# Altium footprint library lib_protel_HC_BOINA.PCBLIB: 726 footprints (part 14 of 46)
Each footprint in its own frame and in the unit in brackets; x right, y up, seen from the top. Pads: shape width x height; smd on the part's side, far side on the other; paste and mask are expansions set on the pad; w line width, h text height; cw(c..) or ccw(c..) is an arc to the next point about the centre after c.
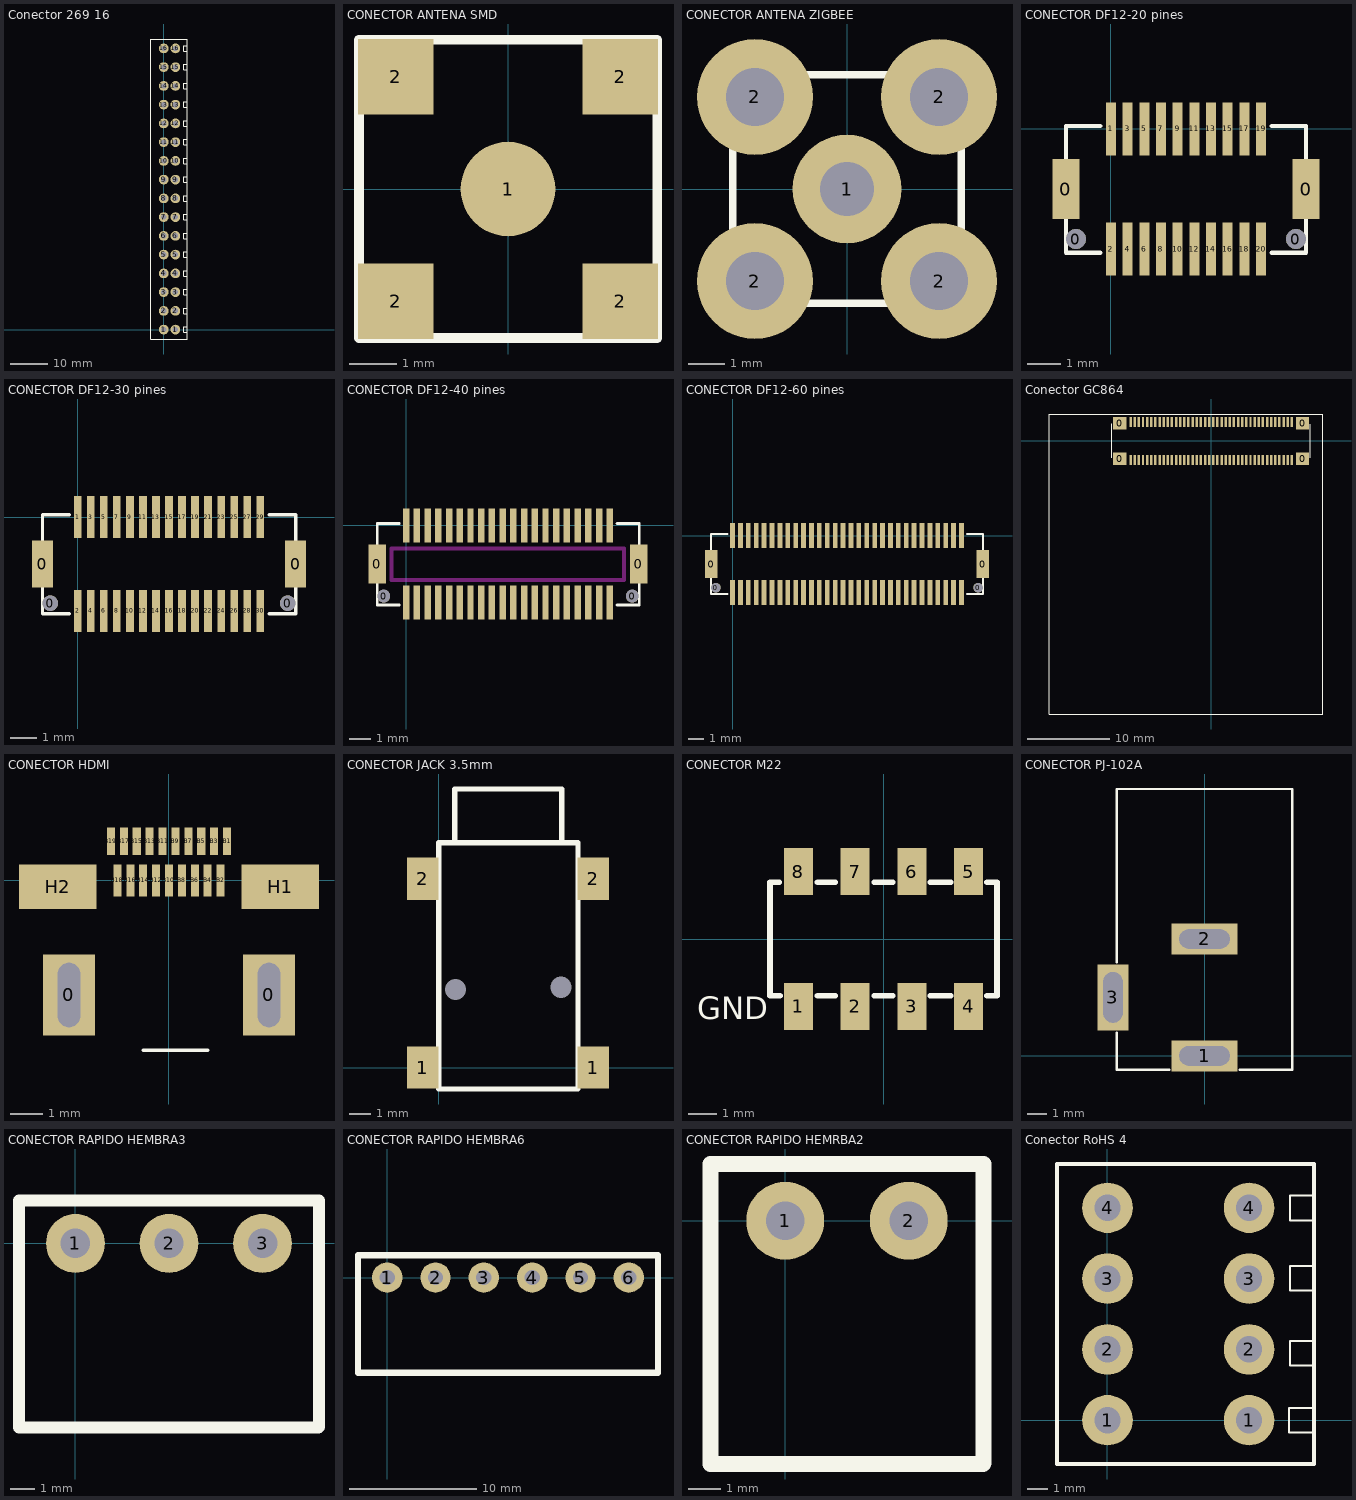
[diagram p13: the footprints below, top view; thin cyan lines are the x and y axes]

## Conector 269 16 [mm] "31269116"
height 16.5
pads (32):
  round 2.6 hole 1.4: 1(0,0) 1(3.1,0) 2(0,5) 2(3.1,5) 3(0,10) 3(3.1,10) 4(0,15) 4(3.1,15) 5(0,20) 5(3.1,20) 6(0,25) 6(3.1,25) 7(0,30) 7(3.1,30) 8(0,35) 8(3.1,35) 9(0,40) 9(3.1,40) 10(0,45) 10(3.1,45) 11(0,50) 11(3.1,50) 12(0,55) 12(3.1,55) 13(0,60) 13(3.1,60) 14(0,65) 14(3.1,65) 15(0,70) 15(3.1,70) 16(0,75) 16(3.1,75)
Top Overlay:
  lines w0.1: 6.3,-0.75 5.3,-0.75 5.3,0.75 6.3,0.75 ; 6.3,4.25 5.3,4.25 5.3,5.75 6.3,5.75 ; 6.3,9.25 5.3,9.25 5.3,10.75 6.3,10.75 ; 6.3,14.25 5.3,14.25 5.3,15.75 6.3,15.75 ; 6.3,19.25 5.3,19.25 5.3,20.75 6.3,20.75 ; 6.3,24.25 5.3,24.25 5.3,25.75 6.3,25.75 ; 6.3,29.25 5.3,29.25 5.3,30.75 6.3,30.75 ; 6.3,34.25 5.3,34.25 5.3,35.75 6.3,35.75 ; 6.3,39.25 5.3,39.25 5.3,40.75 6.3,40.75 ; 6.3,44.25 5.3,44.25 5.3,45.75 6.3,45.75 ; 6.3,49.25 5.3,49.25 5.3,50.75 6.3,50.75 ; 6.3,54.25 5.3,54.25 5.3,55.75 6.3,55.75 ; 6.3,59.25 5.3,59.25 5.3,60.75 6.3,60.75 ; 6.3,64.25 5.3,64.25 5.3,65.75 6.3,65.75 ; 6.3,69.25 5.3,69.25 5.3,70.75 6.3,70.75 ; 6.3,74.25 5.3,74.25 5.3,75.75 6.3,75.75 ; -3.5,-2.5 -3.5,77.5 6.3,77.5 6.3,-2.5 -3.5,-2.5

## CONECTOR ANTENA SMD [mm]
pads (5):
  round 2 smd: 1(0,0)
  rect 1.6x1.6 smd: 2(-2.37,-2.37) 2(-2.37,2.37) 2(2.37,-2.37) 2(2.37,2.37)
Top Overlay:
  lines w0.203: 3.123,-3.15 -3.15,-3.15 -3.15,3.15 3.123,3.15 ; 3.15,-3.15 3.15,3.15

## CONECTOR ANTENA ZIGBEE [mm]
pads (5):
  round 3 hole 1.5: 1(0,0)
  round 3.2 hole 1.6: 2(-2.54,-2.54) 2(-2.54,2.54) 2(2.54,-2.54) 2(2.54,2.54)
Top Overlay:
  lines w0.203: 3.123,-3.15 -3.15,-3.15 -3.15,3.15 3.123,3.15 ; 3.15,-3.15 3.15,3.15

## CONECTOR DF12-20 pines [mm] "microconector macho o hembra 3mm altura"
height 3
pads (24):
  rect 0.8x1.8 smd: 0(-1.35,-1.8) 0(5.85,-1.8)
  round 0.6 hole 0.6 mask+0: 0(-1.05,-3.3) 0(5.55,-3.3)
  rect 0.3x1.6 smd mask+0.102: 1(0,0) 2(0,-3.6) 3(0.5,0) 4(0.5,-3.6) 5(1,0) 6(1,-3.6) 7(1.5,0) 8(1.5,-3.6) 9(2,0) 10(2,-3.6) 11(2.5,0) 12(2.5,-3.6) 13(3,0) 14(3,-3.6) 15(3.5,0) 16(3.5,-3.6) 17(4,0) 18(4,-3.6) 19(4.5,0) 20(4.5,-3.6)
Top Overlay:
  lines w0.127: -0.32,-3.71 -1.35,-3.71 -1.35,0.09 -0.32,0.09 ; 4.82,-3.71 5.85,-3.71 5.85,0.09 4.82,0.09

## CONECTOR DF12-30 pines [mm] "microconector macho o hembra 3mm altura"
height 3
pads (34):
  rect 0.8x1.8 smd: 0(-1.35,-1.8) 0(8.35,-1.8)
  round 0.6 hole 0.6 mask+0: 0(-1.05,-3.3) 0(8.05,-3.3)
  rect 0.3x1.6 smd mask+0.102: 1(0,0) 2(0,-3.6) 3(0.5,0) 4(0.5,-3.6) 5(1,0) 6(1,-3.6) 7(1.5,0) 8(1.5,-3.6) 9(2,0) 10(2,-3.6) 11(2.5,0) 12(2.5,-3.6) 13(3,0) 14(3,-3.6) 15(3.5,0) 16(3.5,-3.6) 17(4,0) 18(4,-3.6) 19(4.5,0) 20(4.5,-3.6) 21(5,0) 22(5,-3.6) 23(5.5,0) 24(5.5,-3.6) 25(6,0) 26(6,-3.6) 27(6.5,0) 28(6.5,-3.6) 29(7,0) 30(7,-3.6)
Top Overlay:
  lines w0.127: -0.32,-3.71 -1.35,-3.71 -1.35,0.09 -0.32,0.09 ; 7.33,-3.71 8.36,-3.71 8.36,0.09 7.33,0.09

## CONECTOR DF12-40 pines [mm] "microconector macho o hembra 3mm altura"
height 3
pads (44):
  rect 0.8x1.8 smd: 0(-1.35,-1.8) 0(10.85,-1.8)
  round 0.6 hole 0.6 mask+0: 0(-1.05,-3.3) 0(10.55,-3.3)
  rect 0.3x1.6 smd mask+0.102: 1(0,0) 2(0,-3.6) 3(0.5,0) 4(0.5,-3.6) 5(1,0) 6(1,-3.6) 7(1.5,0) 8(1.5,-3.6) 9(2,0) 10(2,-3.6) 11(2.5,0) 12(2.5,-3.6) 13(3,0) 14(3,-3.6) 15(3.5,0) 16(3.5,-3.6) 17(4,0) 18(4,-3.6) 19(4.5,0) 20(4.5,-3.6) 21(5,0) 22(5,-3.6) 23(5.5,0) 24(5.5,-3.6) 25(6,0) 26(6,-3.6) 27(6.5,0) 28(6.5,-3.6) 29(7,0) 30(7,-3.6) 31(7.5,0) 32(7.5,-3.6) 33(8,0) 34(8,-3.6) 35(8.5,0) 36(8.5,-3.6) 37(9,0) 38(9,-3.6) 39(9.5,0) 40(9.5,-3.6)
Top Layer keep-out:
  lines w0.178: -0.69,-2.55 -0.69,-1.07 10.17,-1.07 10.17,-2.55 -0.69,-2.55
Top Overlay:
  lines w0.127: -0.32,-3.71 -1.35,-3.71 -1.35,0.09 -0.32,0.09 ; 9.84,-3.71 10.87,-3.71 10.87,0.09 9.84,0.09

## CONECTOR DF12-60 pines [mm] "microconector macho o hembra 3mm altura"
height 3
pads (64):
  rect 0.8x1.8 smd: 0(-1.35,-1.8) 0(15.85,-1.8)
  round 0.6 hole 0.6 mask+0: 0(-1.05,-3.3) 0(15.55,-3.3)
  rect 0.3x1.6 smd mask+0.102: 1(0,0) 2(0,-3.6) 3(0.5,0) 4(0.5,-3.6) 5(1,0) 6(1,-3.6) 7(1.5,0) 8(1.5,-3.6) 9(2,0) 10(2,-3.6) 11(2.5,0) 12(2.5,-3.6) 13(3,0) 14(3,-3.6) 15(3.5,0) 16(3.5,-3.6) 17(4,0) 18(4,-3.6) 19(4.5,0) 20(4.5,-3.6) 21(5,0) 22(5,-3.6) 23(5.5,0) 24(5.5,-3.6) 25(6,0) 26(6,-3.6) 27(6.5,0) 28(6.5,-3.6) 29(7,0) 30(7,-3.6) 31(7.5,0) 32(7.5,-3.6) 33(8,0) 34(8,-3.6) 35(8.5,0) 36(8.5,-3.6) 37(9,0) 38(9,-3.6) 39(9.5,0) 40(9.5,-3.6) 41(10,0) 42(10,-3.6) 43(10.5,0) 44(10.5,-3.6) 45(11,0) 46(11,-3.6) 47(11.5,0) 48(11.5,-3.6) 49(12,0) 50(12,-3.6) 51(12.5,0) 52(12.5,-3.6) 53(13,0) 54(13,-3.6) 55(13.5,0) 56(13.5,-3.6) 57(14,0) 58(14,-3.6) 59(14.5,0) 60(14.5,-3.6)
Top Overlay:
  lines w0.127: -0.32,-3.71 -1.35,-3.71 -1.35,0.09 -0.32,0.09 ; 14.84,-3.71 15.87,-3.71 15.87,0.09 14.84,0.09

## Conector GC864 [mm]
height 2
pads (84):
  rect 1.6x1.5 smd: 0(-11.05,-2.15) 0(-11.05,2.15) 0(11.05,-2.15) 0(11.05,2.15)
  rect 0.3x1.2 smd mask+0.07: 1(-9.75,2.3) 2(-9.75,-2.3) 3(-9.25,2.3) 4(-9.25,-2.3) 5(-8.75,2.3) 6(-8.75,-2.3) 7(-8.25,2.3) 8(-8.25,-2.3) 9(-7.75,2.3) 10(-7.75,-2.3) 11(-7.25,2.3) 12(-7.25,-2.3) 13(-6.75,2.3) 14(-6.75,-2.3) 15(-6.25,2.3) 16(-6.25,-2.3) 17(-5.75,2.3) 18(-5.75,-2.3) 19(-5.25,2.3) 20(-5.25,-2.3) 21(-4.75,2.3) 22(-4.75,-2.3) 23(-4.25,2.3) 24(-4.25,-2.3) 25(-3.75,2.3) 26(-3.75,-2.3) 27(-3.25,2.3) 28(-3.25,-2.3) 29(-2.75,2.3) 30(-2.75,-2.3) 31(-2.25,2.3) 32(-2.25,-2.3) 33(-1.75,2.3) 34(-1.75,-2.3) 35(-1.25,2.3) 36(-1.25,-2.3) 37(-0.75,2.3) 38(-0.75,-2.3) 39(-0.25,2.3) 40(-0.25,-2.3) 41(0.25,2.3) 42(0.25,-2.3) 43(0.75,2.3) 44(0.75,-2.3) 45(1.25,2.3) 46(1.25,-2.3) 47(1.75,2.3) 48(1.75,-2.3) 49(2.25,2.3) 50(2.25,-2.3) 51(2.75,2.3) 52(2.75,-2.3) 53(3.25,2.3) 54(3.25,-2.3) 55(3.75,2.3) 56(3.75,-2.3) 57(4.25,2.3) 58(4.25,-2.3) 59(4.75,2.3) 60(4.75,-2.3) 61(5.25,2.3) 62(5.25,-2.3) 63(5.75,2.3) 64(5.75,-2.3) 65(6.25,2.3) 66(6.25,-2.3) 67(6.75,2.3) 68(6.75,-2.3) 69(7.25,2.3) 70(7.25,-2.3) 71(7.75,2.3) 72(7.75,-2.3) 73(8.25,2.3) 74(8.25,-2.3) 75(8.75,2.3) 76(8.75,-2.3) 77(9.25,2.3) 78(9.25,-2.3) 79(9.75,2.3) 80(9.75,-2.3)
Top Overlay:
  lines w0.1: -12,-2.05 -12,2.05 ; 12,-2.05 12,2.025 ; -19.6,-33.025 -19.6,3.25 13.5,3.25 13.5,-33.025 -19.6,-33.025

## CONECTOR HDMI [mm] "CONECTOR FOR HDMI"
height 2.9
pads (23):
  rect 1.6x2.5 hole 0.7 slot 2 at 90 deg: 0(-3.1,-3.55) 0(3.1,-3.55)
  rect 0.25x0.85 smd: B1(1.8,1.21) B3(1.4,1.21) B5(1,1.21) B7(0.6,1.21) B9(0.2,1.21) B11(-0.2,1.21) B13(-0.6,1.21) B15(-1,1.21) B17(-1.4,1.21) B19(-1.8,1.21)
  rect 0.25x1 smd: B2(1.6,0) B4(1.2,0) B6(0.8,0) B8(0.4,0) B10(0,0) B12(-0.4,0) B14(-0.8,0) B16(-1.2,0) B18(-1.6,0)
  rect 2.4x1.38 smd: H1(3.45,-0.19) H2(-3.45,-0.19)
Top Overlay:
  lines w0.1: -0.8,-5.265 1.2,-5.265

## CONECTOR JACK 3.5mm [mm] "conector jack 3.5mm hembra SMD"
height 5
pads (6):
  round 0 on Top hole 1: 0(0.8,3.7) 0(5.8,3.81)
  rect 1.5x2 smd: 1(-0.762,0) 1(7.338,0) 2(-0.762,8.95) 2(7.338,8.95)
Top Overlay:
  lines w0.254: 0.762,10.668 0.762,13.208 5.842,13.208 5.842,10.668 ; 0,-1.016 6.604,-1.016 6.604,10.668 0,10.668 0,-1.016

## CONECTOR M22 [mm] "Conector programador smd"
height 6.7
pads (8):
  rect 1.02x1.65 smd: 1(-3,-2.375) 2(-1,-2.375) 3(1,-2.375) 4(3,-2.375) 5(3,2.375) 6(1,2.375) 7(-1,2.375) 8(-3,2.375)
Top Overlay:
  lines w0.2: -3.675,2 -4,2 -4,-2 -3.65,-2 ; -2.325,-2 -1.7,-2 ; -2.325,2 -1.7,2 ; -0.325,-2 0.325,-2 ; -0.325,2 0.325,2 ; 1.65,-2 2.375,-2 ; 1.65,2 2.375,2 ; 3.65,-2 4,-2 4,2 3.65,2
  text "GND" at -6.575,-2.825 h0.8

## CONECTOR PJ-102A [mm] "CONECTOR ALIMETACIÓN 2.1MM"
height 11
pads (3):
  rect 3.4x1.6 hole 1 slot 2.6 at 0 deg: 1(0,0) 2(0,6)
  rect 1.6x3.4 hole 1 slot 2.6 at 90 deg: 3(-4.7,3)
Top Overlay:
  lines w0.127: -4.51,-0.7 -1.82,-0.7 ; -4.51,-0.68 -4.51,1.19 ; -4.5,4.81 -4.5,13.7 ; -4.49,13.7 4.48,13.7 ; 1.82,-0.7 4.5,-0.7 4.5,13.7

## CONECTOR RAPIDO HEMBRA3 [mm] "Paso3.81mm altura 7mm"
height 7
pads (3):
  round 2.4 hole 1.2: 1(0,0) 2(3.81,0) 3(7.62,0)
Top Overlay:
  lines w0.5: -2.3,-7.5 9.9,-7.5 ; -2.3,-7.475 -2.3,1.75 9.875,1.75 ; 9.92,-7.475 9.92,1.75

## CONECTOR RAPIDO HEMBRA6 [mm] "Paso 3.81mm altura 7mm"
height 7
pads (6):
  round 2.4 hole 1.2: 1(0,0) 2(3.81,0) 3(7.62,0) 4(11.43,0) 5(15.24,0) 6(19.05,0)
Top Overlay:
  lines w0.5: -2.3,-7.5 21.35,-7.5 21.35,1.75 -2.3,1.75 -2.3,-7.475

## CONECTOR RAPIDO HEMRBA2 [mm] "Paso 3.81mm altura 7mm"
height 7
pads (2):
  round 2.4 hole 1.2: 1(0,0) 2(3.81,0)
Top Overlay:
  lines w0.5: -2.3,-7.5 6.1,-7.5 ; -2.3,-7.475 -2.3,1.75 6.11,1.75 6.11,-7.475

## Conector RoHS 4 [mm] "1824440000"
height 16.5
pads (8):
  round 2.5 hole 1.3: 1(0.01,0) 1(7.01,0) 2(0.01,3.5) 2(7.01,3.5) 3(0.01,7) 3(7.01,7) 4(0.01,10.5) 4(7.01,10.5)
Top Overlay:
  lines w0.1: 10.221,-0.61 8.993,-0.61 8.993,0.61 10.221,0.61 ; 10.272,2.692 9.043,2.692 9.043,3.912 10.272,3.912 ; 10.272,6.401 9.043,6.401 9.043,7.62 10.272,7.62 ; 10.272,9.881 9.043,9.881 9.043,11.1 10.272,11.1
  lines w0.2: -2.489,-2.167 -2.489,12.667 10.221,12.667 10.221,-2.167 -2.489,-2.167